# Altium footprint library CONN_W2B_JST.PcbLib: 130 footprints (part 6 of 9)
Each footprint in its own frame and in the unit in brackets; x right, y up, seen from the top. Pads: shape width x height; smd on the part's side, far side on the other; paste and mask are expansions set on the pad; w line width, h text height; cw(c..) or ccw(c..) is an arc to the next point about the centre after c.
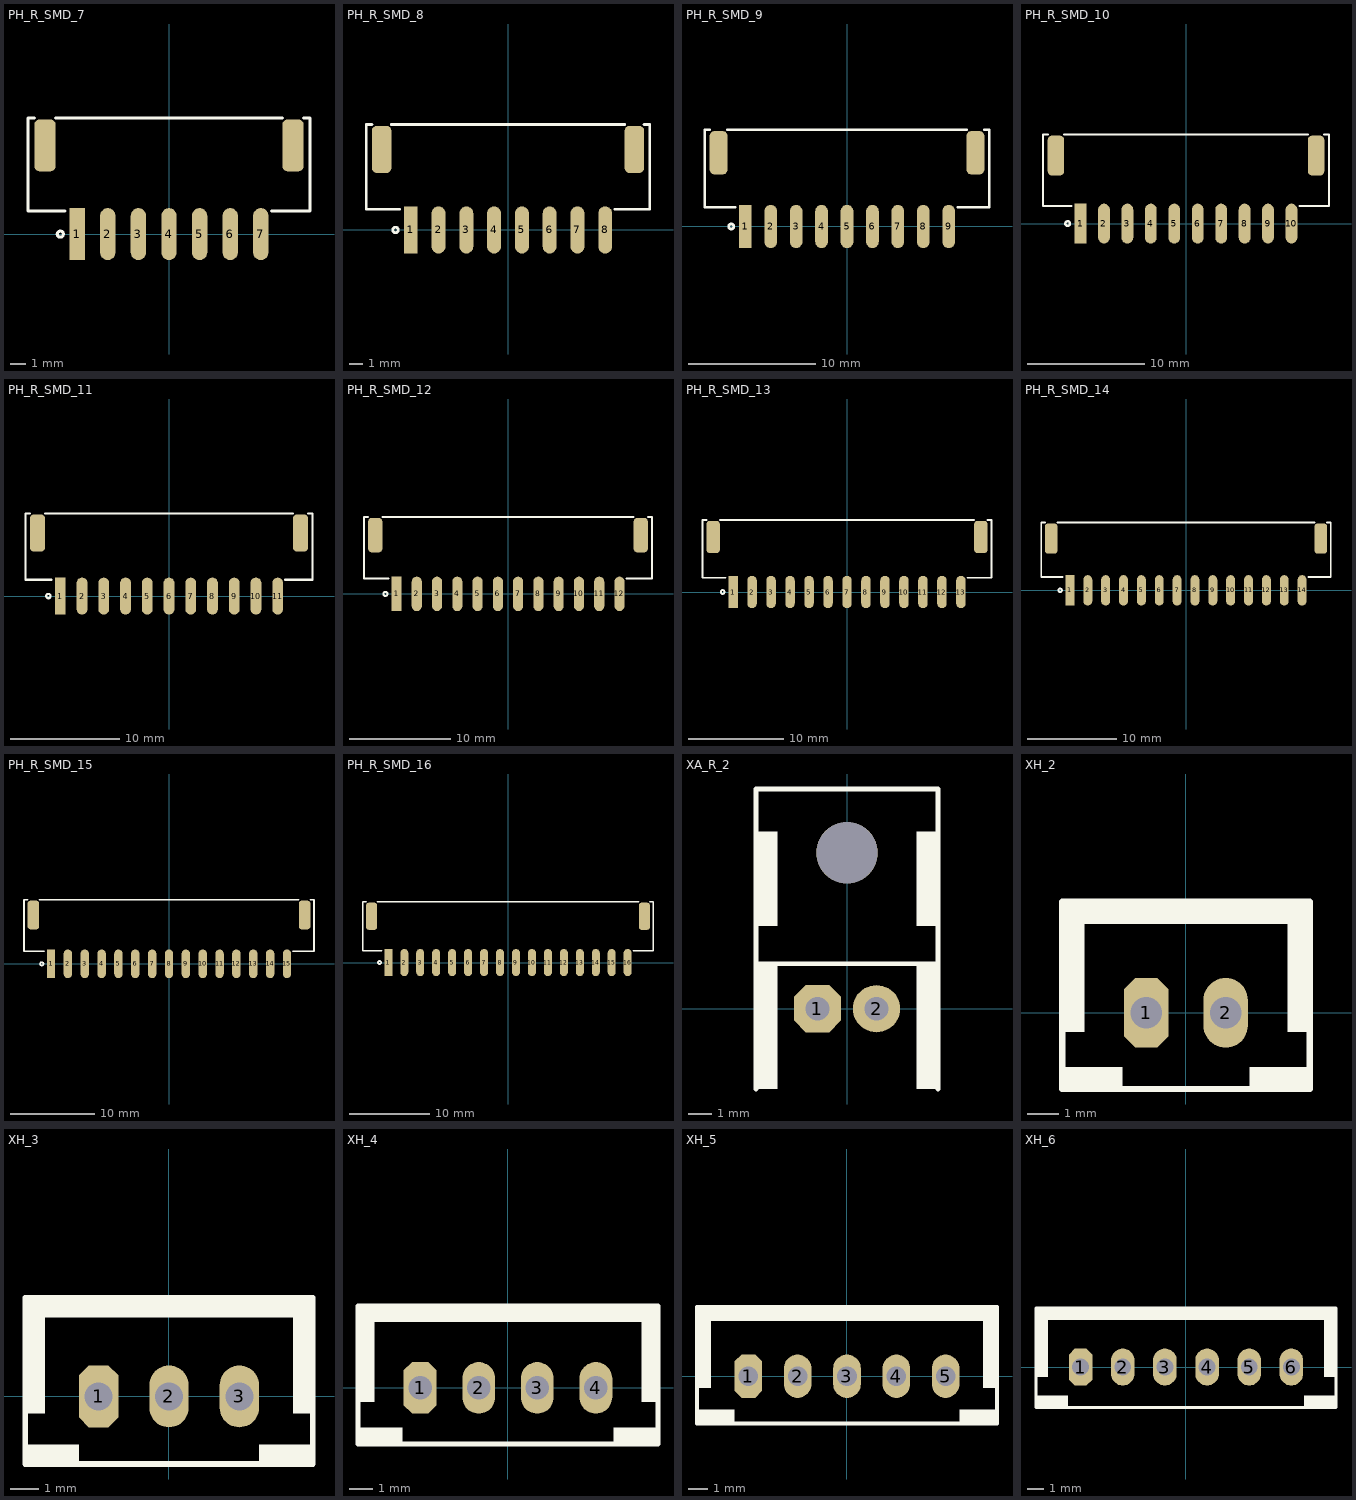
[diagram p5: the footprints below, top view; thin cyan lines are the x and y axes]

## PH_R_SMD_7 [mm] "JST PH Series, pitch: 2.0mm, 2.0A/100v, Right Angle, SMD"
pads (9):
  rect 1x3.4 smd: 1(-6,0)
  oval 1x3.4 smd: 2(-4,0) 3(-2,0) 4(0,0) 5(2,0) 6(4,0) 7(6,0)
  rrect50% 1.4x3.4 smd: ""(-8.1,5.8) ""(8.1,5.8)
Top Overlay:
  circle w0.2: c-7.1,0 r0.2
  lines w0.2: -8.8,7.6 -9.2,7.6 -9.2,1.5 -6.8,1.5 ; -7.4,7.6 7.4,7.6 ; 6.7,1.5 9.2,1.5 9.2,7.6 8.8,7.6
3D body "JST - PH - SMD (R) - 7Pin - 2.00mm.stp": height 5.38, standoff 0, extent -9.073,-0.8 9.073,7.455

## PH_R_SMD_8 [mm] "JST PH Series, pitch: 2.0mm, 2.0A/100v, Right Angle, SMD"
pads (10):
  rect 1x3.4 smd: 1(-7,0)
  oval 1x3.4 smd: 2(-5,0) 3(-3,0) 4(-1,0) 5(1,0) 6(3,0) 7(5,0) 8(7,0)
  rrect50% 1.4x3.4 smd: ""(-9.1,5.8) ""(9.1,5.8)
Top Overlay:
  circle w0.2: c-8.1,0 r0.2
  lines w0.2: -9.8,7.6 -10.2,7.6 -10.2,1.5 -7.8,1.5 ; -8.4,7.6 8.4,7.6 ; 7.7,1.5 10.2,1.5 10.2,7.6 9.8,7.6
3D body "JST - PH - SMD (R) - 8Pin - 2.00mm.stp": height 5.38, standoff 0, extent -10.073,-0.8 10.073,7.455

## PH_R_SMD_9 [mm] "JST PH Series, pitch: 2.0mm, 2.0A/100v, Right Angle, SMD"
pads (11):
  rect 1x3.4 smd: 1(-8,0)
  oval 1x3.4 smd: 2(-6,0) 3(-4,0) 4(-2,0) 5(0,0) 6(2,0) 7(4,0) 8(6,0) 9(8,0)
  rrect50% 1.4x3.4 smd: ""(-10.1,5.8) ""(10.1,5.8)
Top Overlay:
  circle w0.2: c-9.1,0 r0.2
  lines w0.2: -10.8,7.6 -11.2,7.6 -11.2,1.5 -8.8,1.5 ; -9.4,7.6 9.4,7.6 ; 8.7,1.5 11.2,1.5 11.2,7.6 10.8,7.6
3D body "JST - PH - SMD (R) - 9Pin - 2.00mm.stp": height 5.38, standoff 0, extent -11.073,-0.8 11.073,7.455

## PH_R_SMD_10 [mm] "JST PH Series, pitch: 2.0mm, 2.0A/100v, Right Angle, SMD"
pads (12):
  rect 1x3.4 smd: 1(-9,0)
  oval 1x3.4 smd: 2(-7,0) 3(-5,0) 4(-3,0) 5(-1,0) 6(1,0) 7(3,0) 8(5,0) 9(7,0) 10(9,0)
  rrect50% 1.4x3.4 smd: ""(-11.1,5.8) ""(11.1,5.8)
Top Overlay:
  circle w0.2: c-10.1,0 r0.2
  lines w0.2: -11.8,7.6 -12.2,7.6 -12.2,1.5 -9.8,1.5 ; -10.4,7.6 10.4,7.6 ; 9.7,1.5 12.2,1.5 12.2,7.6 11.8,7.6
3D body "JST - PH - SMD (R) - 10Pin - 2.00mm.stp": height 5.38, standoff 0, extent -12.073,-0.8 12.073,7.455

## PH_R_SMD_11 [mm] "JST PH Series, pitch: 2.0mm, 2.0A/100v, Right Angle, SMD"
pads (13):
  rect 1x3.4 smd: 1(-10,0)
  oval 1x3.4 smd: 2(-8,0) 3(-6,0) 4(-4,0) 5(-2,0) 6(0,0) 7(2,0) 8(4,0) 9(6,0) 10(8,0) 11(10,0)
  rrect50% 1.4x3.4 smd: ""(-12.1,5.8) ""(12.1,5.8)
Top Overlay:
  circle w0.2: c-11.1,0 r0.2
  lines w0.2: -12.8,7.6 -13.2,7.6 -13.2,1.5 -10.8,1.5 ; -11.4,7.6 11.4,7.6 ; 10.7,1.5 13.2,1.5 13.2,7.6 12.8,7.6
3D body "JST - PH - SMD (R) - 11Pin - 2.00mm.stp": height 5.38, standoff 0, extent -13.073,-0.8 13.073,7.455

## PH_R_SMD_12 [mm] "JST PH Series, pitch: 2.0mm, 2.0A/100v, Right Angle, SMD"
pads (14):
  rect 1x3.4 smd: 1(-11,0)
  oval 1x3.4 smd: 2(-9,0) 3(-7,0) 4(-5,0) 5(-3,0) 6(-1,0) 7(1,0) 8(3,0) 9(5,0) 10(7,0) 11(9,0) 12(11,0)
  rrect50% 1.4x3.4 smd: ""(-13.1,5.8) ""(13.1,5.8)
Top Overlay:
  circle w0.2: c-12.1,0 r0.2
  lines w0.2: -13.8,7.6 -14.2,7.6 -14.2,1.5 -11.8,1.5 ; -12.4,7.6 12.4,7.6 ; 11.7,1.5 14.2,1.5 14.2,7.6 13.8,7.6
3D body "JST - PH - SMD (R) - 12Pin - 2.00mm.stp": height 5.38, standoff 0, extent -14.073,-0.8 14.073,7.455

## PH_R_SMD_13 [mm] "JST PH Series, pitch: 2.0mm, 2.0A/100v, Right Angle, SMD"
pads (15):
  rect 1x3.4 smd: 1(-12,0)
  oval 1x3.4 smd: 2(-10,0) 3(-8,0) 4(-6,0) 5(-4,0) 6(-2,0) 7(0,0) 8(2,0) 9(4,0) 10(6,0) 11(8,0) 12(10,0) 13(12,0)
  rrect50% 1.4x3.4 smd: ""(-14.1,5.8) ""(14.1,5.8)
Top Overlay:
  circle w0.2: c-13.1,0 r0.2
  lines w0.2: -14.8,7.6 -15.2,7.6 -15.2,1.5 -12.8,1.5 ; -13.4,7.6 13.4,7.6 ; 12.7,1.5 15.2,1.5 15.2,7.6 14.8,7.6
3D body "JST - PH - SMD (R) - 13Pin - 2.00mm.stp": height 5.38, standoff 0, extent -15.073,-0.8 15.073,7.455

## PH_R_SMD_14 [mm] "JST PH Series, pitch: 2.0mm, 2.0A/100v, Right Angle, SMD"
pads (16):
  rect 1x3.4 smd: 1(-13,0)
  oval 1x3.4 smd: 2(-11,0) 3(-9,0) 4(-7,0) 5(-5,0) 6(-3,0) 7(-1,0) 8(1,0) 9(3,0) 10(5,0) 11(7,0) 12(9,0) 13(11,0) 14(13,0)
  rrect50% 1.4x3.4 smd: ""(-15.1,5.8) ""(15.1,5.8)
Top Overlay:
  circle w0.2: c-14.1,0 r0.2
  lines w0.2: -15.8,7.6 -16.2,7.6 -16.2,1.5 -13.8,1.5 ; -14.4,7.6 14.4,7.6 ; 13.7,1.5 16.2,1.5 16.2,7.6 15.8,7.6
3D body "JST - PH - SMD (R) - 14Pin - 2.00mm.stp": height 5.38, standoff 0, extent -16.073,-0.8 16.073,7.455

## PH_R_SMD_15 [mm] "JST PH Series, pitch: 2.0mm, 2.0A/100v, Right Angle, SMD"
pads (17):
  rect 1x3.4 smd: 1(-14,0)
  oval 1x3.4 smd: 2(-12,0) 3(-10,0) 4(-8,0) 5(-6,0) 6(-4,0) 7(-2,0) 8(0,0) 9(2,0) 10(4,0) 11(6,0) 12(8,0) 13(10,0) 14(12,0) 15(14,0)
  rrect50% 1.4x3.4 smd: ""(-16.1,5.8) ""(16.1,5.8)
Top Overlay:
  circle w0.2: c-15.1,0 r0.2
  lines w0.2: -16.8,7.6 -17.2,7.6 -17.2,1.5 -14.8,1.5 ; -15.4,7.6 15.4,7.6 ; 14.7,1.5 17.2,1.5 17.2,7.6 16.8,7.6
3D body "JST - PH - SMD (R) - 15Pin - 2.00mm.stp": height 5.38, standoff 0, extent -17.073,-0.8 17.073,7.455

## PH_R_SMD_16 [mm] "JST PH Series, pitch: 2.0mm, 2.0A/100v, Right Angle, SMD"
pads (18):
  rect 1x3.4 smd: 1(-15,0)
  oval 1x3.4 smd: 2(-13,0) 3(-11,0) 4(-9,0) 5(-7,0) 6(-5,0) 7(-3,0) 8(-1,0) 9(1,0) 10(3,0) 11(5,0) 12(7,0) 13(9,0) 14(11,0) 15(13,0) 16(15,0)
  rrect50% 1.4x3.4 smd: ""(-17.1,5.8) ""(17.1,5.8)
Top Overlay:
  circle w0.2: c-16.1,0 r0.2
  lines w0.2: -17.8,7.6 -18.2,7.6 -18.2,1.5 -15.8,1.5 ; -16.4,7.6 16.4,7.6 ; 15.7,1.5 18.2,1.5 18.2,7.6 17.8,7.6
3D body "JST - PH - SMD (R) - 16Pin - 2.00mm.stp": height 5.38, standoff 0, extent -18.073,-0.8 18.073,7.455

## XA_R_2 [mm] "JST S02B-XASS-1 pitch: 2.5mm"
pads (3):
  oct 2x2 hole 1: 1(-1.25,0)
  round 2 hole 1: 2(1.25,0)
  round 2.6 hole 2.6 unplated: ""(0,6.6)
Top Overlay:
  region: 3.85,1.9 2.95,1.9 2.95,-3.4 3.85,-3.4
  rectangle: -3.85,-3.4 -2.95,1.9
  region: 3.85,7.5 2.95,7.5 2.95,3.5 3.85,3.5
  rectangle: -3.85,3.5 -2.95,7.5
  lines w0.2: -3.85,-3.4 -3.85,9.3 3.85,9.3 3.85,-3.4 ; -3.85,1.9 3.85,1.9
3D body "S02B-XASS-1.STEP": height 7.6, standoff -3.5, extent -3.75,-3.4 3.75,9.2

## XH_2 [mm] "PW10-x-M, JST-BxB-XH-A pitch: 2.5mm, 3A/250v"
pads (2):
  oct 1.4x2.2 hole 1: 1(-1.25,0)
  oval 1.4x2.2 hole 1: 2(1.25,0)
Top Overlay:
  region: 3.9,-1.7 2,-1.7 2,-2.4 3.9,-2.4
  region: 3.9,3.5 3.2,3.5 3.2,-0.6 3.9,-0.6
  region: -3.9,3.5 -3.9,2.8 3.9,2.8 3.9,3.5
  rectangle: -3.9,-0.6 -3.2,3.5
  rectangle: -3.9,-2.4 -2,-1.7
  lines w0.2: -3.9,-2.4 -3.9,3.5 3.9,3.5 3.9,-2.4 -3.9,-2.4
3D body "User Library-PW10-02-M white.step": height 7, standoff -3.3, extent -3.75,-2.3 3.75,3.4

## XH_3 [mm] "PW10-x-M, JST-BxB-XH-A pitch: 2.5mm, 3A/250v"
pads (3):
  oct 1.4x2.2 hole 1: 1(-2.5,0)
  oval 1.4x2.2 hole 1: 2(0,0) 3(2.5,0)
Top Overlay:
  region: 5.1,-1.7 3.2,-1.7 3.2,-2.4 5.1,-2.4
  region: 5.1,3.5 4.4,3.5 4.4,-0.6 5.1,-0.6
  region: -5.1,3.5 -5.1,2.8 5.1,2.8 5.1,3.5
  rectangle: -5.1,-0.6 -4.4,3.5
  rectangle: -5.1,-2.4 -3.2,-1.7
  lines w0.2: -5.1,-2.4 -5.1,3.5 5.1,3.5 5.1,-2.4 -5.1,-2.4
3D body "User Library-PW10-03-M white.step": height 7, standoff -3.3, extent -5,-2.3 5,3.4

## XH_4 [mm] "PW10-x-M, JST-BxB-XH-A pitch: 2.5mm, 3A/250v"
pads (4):
  oct 1.4x2.2 hole 1: 1(-3.75,0)
  oval 1.4x2.2 hole 1: 2(-1.25,0) 3(1.25,0) 4(3.75,0)
Top Overlay:
  region: 6.4,-1.7 4.5,-1.7 4.5,-2.4 6.4,-2.4
  region: 6.4,3.5 5.7,3.5 5.7,-0.6 6.4,-0.6
  region: -6.4,3.5 -6.4,2.8 6.4,2.8 6.4,3.5
  rectangle: -6.4,-0.6 -5.7,3.5
  rectangle: -6.4,-2.4 -4.5,-1.7
  lines w0.2: -6.4,-2.4 -6.4,3.5 6.4,3.5 6.4,-2.4 -6.4,-2.4
3D body "User Library-PW10-04-M white.step": height 7, standoff -3.3, extent -6.25,-2.3 6.25,3.4

## XH_5 [mm] "PW10-x-M, JST-BxB-XH-A pitch: 2.5mm, 3A/250v"
pads (5):
  oct 1.4x2.2 hole 1: 1(-5,0)
  oval 1.4x2.2 hole 1: 2(-2.5,0) 3(0,0) 4(2.5,0) 5(5,0)
Top Overlay:
  rectangle: -7.6,-2.4 -5.7,-1.7
  rectangle: -7.6,-0.6 -6.9,3.5
  region: -7.6,3.5 -7.6,2.8 7.6,2.8 7.6,3.5
  region: 7.6,3.5 6.9,3.5 6.9,-0.6 7.6,-0.6
  region: 7.6,-1.7 5.7,-1.7 5.7,-2.4 7.6,-2.4
  lines w0.2: -7.6,-2.4 7.6,-2.4 7.6,3.5 -7.6,3.5 -7.6,-2.4
3D body "User Library-PW10-05-M white.step": height 7, standoff -3.3, extent -7.5,-2.3 7.5,3.4

## XH_6 [mm] "PW10-x-M, JST-BxB-XH-A pitch: 2.5mm, 3A/250v"
pads (6):
  oct 1.4x2.2 hole 1: 1(-6.25,0)
  oval 1.4x2.2 hole 1: 2(-3.75,0) 3(-1.25,0) 4(1.25,0) 5(3.75,0) 6(6.25,0)
Top Overlay:
  rectangle: -8.9,-2.4 -7,-1.7
  rectangle: -8.9,-0.6 -8.2,3.5
  region: -8.9,3.5 -8.9,2.8 8.9,2.8 8.9,3.5
  region: 8.9,3.5 8.2,3.5 8.2,-0.6 8.9,-0.6
  region: 8.9,-1.7 7,-1.7 7,-2.4 8.9,-2.4
  lines w0.2: -8.9,-2.4 8.9,-2.4 8.9,3.5 -8.9,3.5 -8.9,-2.4
3D body "User Library-PW10-06-M white.step": height 7, standoff -3.3, extent -8.75,-2.3 8.75,3.4